# Altium footprint library Flyback Transformers.PcbLib: 66 footprints (part 1 of 5)
Each footprint in its own frame and in the unit in brackets; x right, y up, seen from the top. Pads: shape width x height; smd on the part's side, far side on the other; paste and mask are expansions set on the pad; w line width, h text height; cw(c..) or ccw(c..) is an arc to the next point about the centre after c.
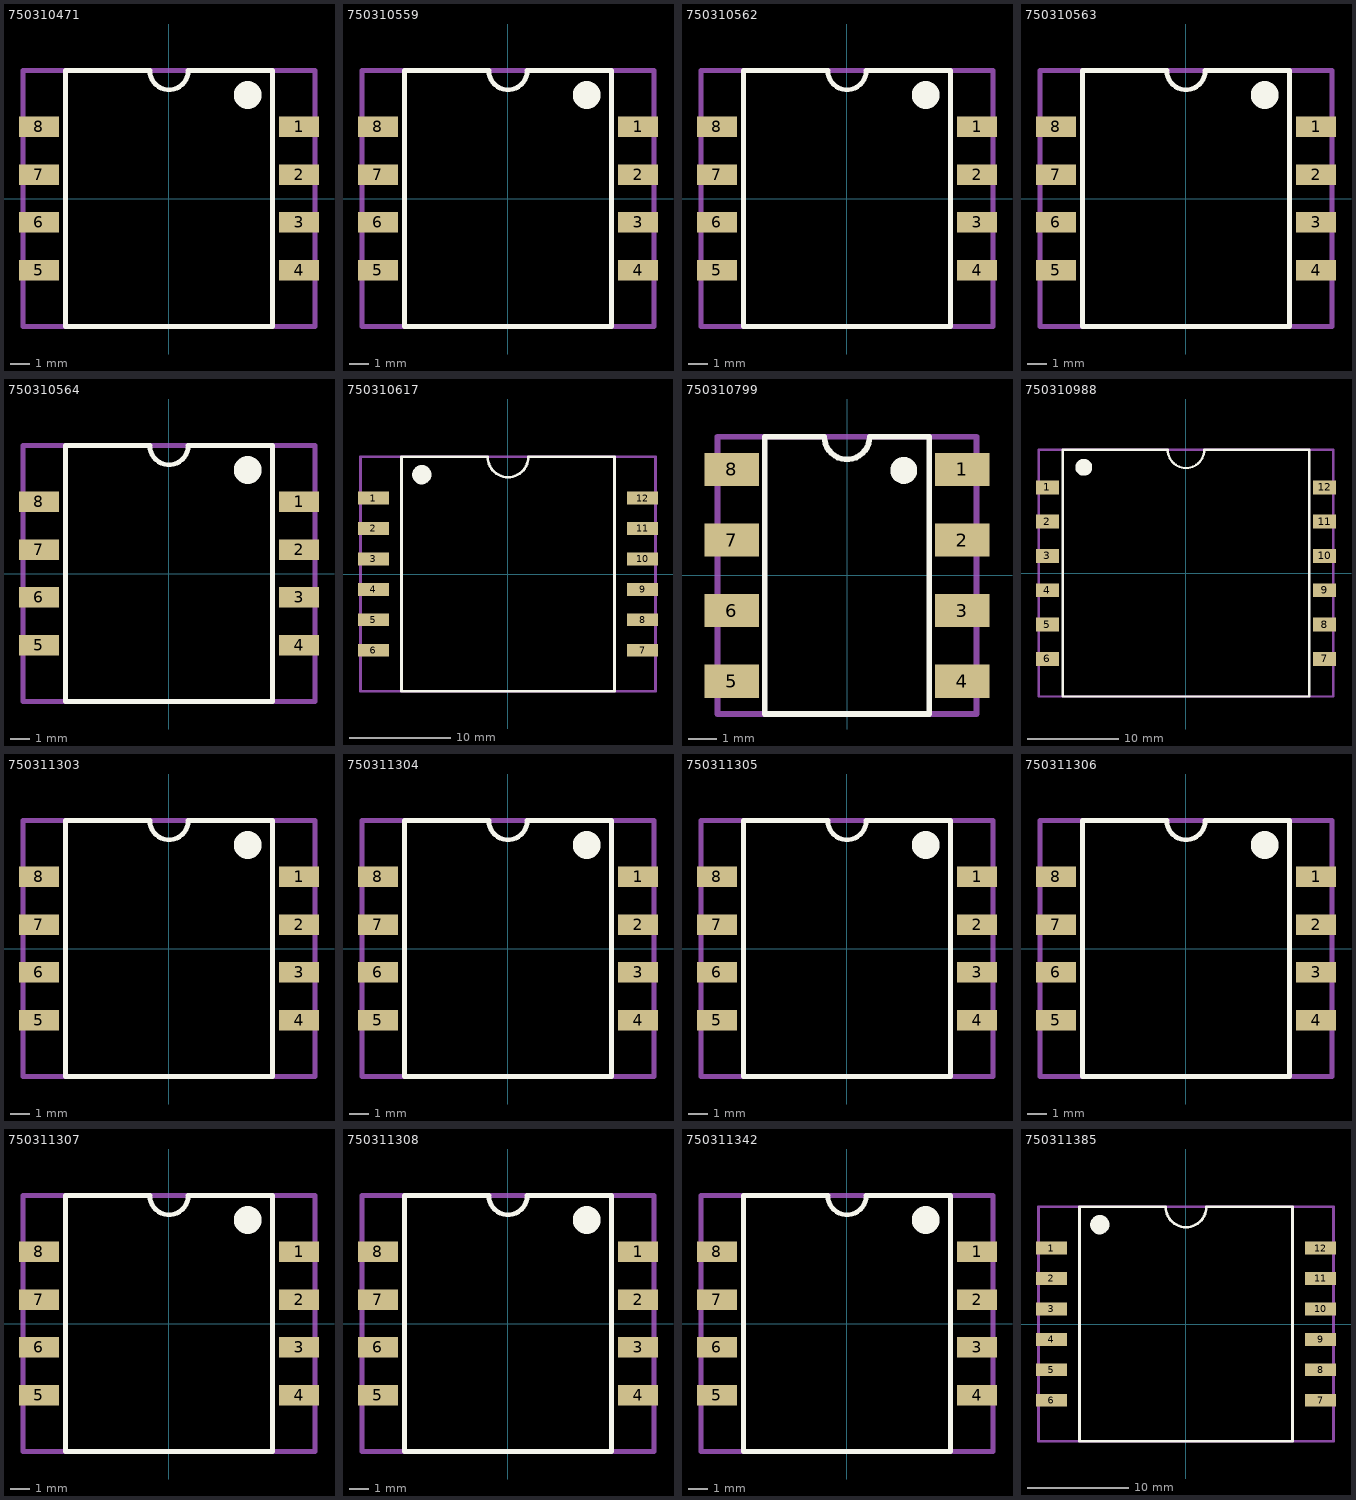
[diagram p0: the footprints below, top view; thin cyan lines are the x and y axes]

## 750310471 [mm] "Flyback Transformer, size EP10"
height 11.43
pads (8):
  rect 2.08x1.07 smd: 1(6.78,3.735) 2(6.78,1.245) 3(6.78,-1.245) 4(6.78,-3.735) 5(-6.78,-3.735) 6(-6.78,-1.245) 7(-6.78,1.245) 8(-6.78,3.735)
Top Overlay:
  circle w1: c4.1,5.4 r0.224
  lines w0.254: -5.4,-6.67 5.4,-6.67 5.4,6.67 1,6.67 cw(c0,6.67) -1,6.67 -5.4,6.67 -5.4,-6.67
Mechanical 13:
  lines w0.254: -7.62,-6.67 7.62,-6.67 7.62,6.67 -7.62,6.67 -7.62,-6.67
3D body "STEP-750310471-rev1.stp": height 11.44, standoff 0.01, extent -7.62,-5.9 7.62,5.9

## 750310559 [mm] "Flyback Transformer, size EP10"
height 11.43
pads (8):
  rect 2.08x1.07 smd: 1(6.78,3.735) 2(6.78,1.245) 3(6.78,-1.245) 4(6.78,-3.735) 5(-6.78,-3.735) 6(-6.78,-1.245) 7(-6.78,1.245) 8(-6.78,3.735)
Top Overlay:
  circle w1: c4.1,5.4 r0.224
  lines w0.254: -5.4,-6.67 5.4,-6.67 5.4,6.67 1,6.67 cw(c0,6.67) -1,6.67 -5.4,6.67 -5.4,-6.67
Mechanical 13:
  lines w0.254: -7.62,-6.67 7.62,-6.67 7.62,6.67 -7.62,6.67 -7.62,-6.67
3D body "STEP-750310559-rev1.stp": height 11.44, standoff 0.01, extent -7.62,-5.9 7.62,5.9

## 750310562 [mm] "Flyback Transformer, size EP10"
height 11.43
pads (8):
  rect 2.08x1.07 smd: 1(6.78,3.735) 2(6.78,1.245) 3(6.78,-1.245) 4(6.78,-3.735) 5(-6.78,-3.735) 6(-6.78,-1.245) 7(-6.78,1.245) 8(-6.78,3.735)
Top Overlay:
  circle w1: c4.1,5.4 r0.224
  lines w0.254: -5.4,-6.67 -5.4,6.67 -1,6.67 ccw(c0,6.67) 1,6.67 5.4,6.67 5.4,-6.67 -5.4,-6.67
Mechanical 13:
  lines w0.254: -7.62,-6.67 -7.62,6.67 7.62,6.67 7.62,-6.67 -7.62,-6.67
3D body "STEP-750310562-rev1.stp": height 11.44, standoff 0.01, extent -7.62,-5.9 7.62,5.9

## 750310563 [mm] "Flyback Transformer, size EP10"
height 11.43
pads (8):
  rect 2.08x1.07 smd: 1(6.78,3.735) 2(6.78,1.245) 3(6.78,-1.245) 4(6.78,-3.735) 5(-6.78,-3.735) 6(-6.78,-1.245) 7(-6.78,1.245) 8(-6.78,3.735)
Top Overlay:
  circle w1: c4.1,5.4 r0.224
  lines w0.254: -5.4,-6.67 -5.4,6.67 -1,6.67 ccw(c0,6.67) 1,6.67 5.4,6.67 5.4,-6.67 -5.4,-6.67
Mechanical 13:
  lines w0.254: -7.62,-6.67 -7.62,6.67 7.62,6.67 7.62,-6.67 -7.62,-6.67
3D body "STEP-750310563-rev1.stp": height 11.44, standoff 0.01, extent -7.62,-5.9 7.62,5.9

## 750310564 [mm] "Flyback Transformer, size EP10"
height 11.43
pads (8):
  rect 2.08x1.07 smd: 1(6.78,3.735) 2(6.78,1.245) 3(6.78,-1.245) 4(6.78,-3.735) 5(-6.78,-3.735) 6(-6.78,-1.245) 7(-6.78,1.245) 8(-6.78,3.735)
Top Overlay:
  circle w1: c4.1,5.4 r0.224
  lines w0.254: -5.4,-6.67 -5.4,6.67 -1,6.67 ccw(c0,6.67) 1,6.67 5.4,6.67 5.4,-6.67 -5.4,-6.67
Mechanical 13:
  lines w0.254: -7.62,-6.67 -7.62,6.67 7.62,6.67 7.62,-6.67 -7.62,-6.67
3D body "STEP-750310564-rev1.stp": height 11.44, standoff 0.01, extent -7.62,-5.9 7.62,5.9

## 750310617 [mm] "Flyback Transformer, size EFD20"
height 11.43
pads (12):
  rect 3.05x1.27 smd: 1(-13.26,7.5) 2(-13.26,4.5) 3(-13.26,1.5) 4(-13.26,-1.5) 5(-13.26,-4.5) 6(-13.26,-7.5) 7(13.26,-7.5) 8(13.26,-4.5) 9(13.26,-1.5) 10(13.26,1.5) 11(13.26,4.5) 12(13.26,7.5)
Top Overlay:
  circle w1: c-8.5,9.8 r0.447
  lines w0.254: -10.5,-11.555 10.5,-11.555 10.5,11.555 2,11.555 cw(c0,11.555) -2,11.555 -10.5,11.555 -10.5,-11.555
Mechanical 13:
  lines w0.254: -14.54,-11.555 -14.54,11.555 14.54,11.555 14.54,-11.555 -14.54,-11.555
3D body "STEP-750310617-rev1.stp": height 11.45, standoff 0.02, extent -14.54,-10 14.54,10

## 750310799 [mm] "Flyback Transformer, size EP7"
height 10.54
pads (8):
  rect 1.91x1.17 smd: 1(4.065,3.735) 2(4.065,1.245) 3(4.065,-1.245) 4(4.065,-3.735) 5(-4.065,-3.735) 6(-4.065,-1.245) 7(-4.065,1.245) 8(-4.065,3.735)
Top Overlay:
  circle w0.5: c2,3.7 r0.224
  lines w0.2: -2.9,-4.89 -2.9,4.89 -0.8,4.89 ccw(c0,4.89) 0.8,4.89 2.9,4.89 2.9,-4.89 -2.9,-4.89
Mechanical 13:
  lines w0.2: -4.57,-4.89 -4.57,4.89 4.57,4.89 4.57,-4.89 -4.57,-4.89
3D body "STEP-750310799-rev1 (1).stp": height 10.55, standoff 0.01, extent -4.57,-4.89 4.57,4.89

## 750310988 [mm] "Flyback Transformer, size EFD25"
height 13.69
pads (12):
  rect 2.5x1.52 smd: 1(-15.19,9.4) 2(-15.19,5.64) 3(-15.19,1.88) 4(-15.19,-1.88) 5(-15.19,-5.64) 6(-15.19,-9.4) 7(15.19,-9.4) 8(15.19,-5.64) 9(15.19,-1.88) 10(15.19,1.88) 11(15.19,5.64) 12(15.19,9.4)
Top Overlay:
  circle w1: c-11.2,11.6 r0.424
  lines w0.254: -13.5,-13.515 -13.5,13.515 -2,13.515 ccw(c0,13.515) 2,13.515 13.5,13.515 13.5,-13.515 -13.5,-13.515
Mechanical 13:
  lines w0.254: -16.155,-13.515 16.155,-13.515 16.155,13.515 -16.155,13.515 -16.155,-13.515
3D body "STEP-750310988-rev1.stp": height 13.05, standoff 0.05, extent -15.75,-12.5 15.75,12.5

## 750311303 [mm] "Flyback Transformer, size EP10"
height 11.43
pads (8):
  rect 2.08x1.07 smd: 1(6.78,3.735) 2(6.78,1.245) 3(6.78,-1.245) 4(6.78,-3.735) 5(-6.78,-3.735) 6(-6.78,-1.245) 7(-6.78,1.245) 8(-6.78,3.735)
Top Overlay:
  circle w1: c4.1,5.4 r0.224
  lines w0.254: -5.4,-6.67 5.4,-6.67 5.4,6.67 1,6.67 cw(c0,6.67) -1,6.67 -5.4,6.67 -5.4,-6.67
Mechanical 13:
  lines w0.254: -7.62,-6.67 7.62,-6.67 7.62,6.67 -7.62,6.67 -7.62,-6.67
3D body "STEP-750311303-rev1.stp": height 11.44, standoff 0.01, extent -7.62,-5.9 7.62,5.9

## 750311304 [mm] "Flyback Transformer, size EP10"
height 11.43
pads (8):
  rect 2.08x1.07 smd: 1(6.78,3.735) 2(6.78,1.245) 3(6.78,-1.245) 4(6.78,-3.735) 5(-6.78,-3.735) 6(-6.78,-1.245) 7(-6.78,1.245) 8(-6.78,3.735)
Top Overlay:
  circle w1: c4.1,5.4 r0.224
  lines w0.254: -5.4,-6.67 5.4,-6.67 5.4,6.67 1,6.67 cw(c0,6.67) -1,6.67 -5.4,6.67 -5.4,-6.67
Mechanical 13:
  lines w0.254: -7.62,-6.67 7.62,-6.67 7.62,6.67 -7.62,6.67 -7.62,-6.67
3D body "STEP-750311304-rev1.stp": height 11.44, standoff 0.01, extent -7.62,-5.9 7.62,5.9

## 750311305 [mm] "Flyback Transformer, size EP10"
height 11.43
pads (8):
  rect 2.08x1.07 smd: 1(6.78,3.735) 2(6.78,1.245) 3(6.78,-1.245) 4(6.78,-3.735) 5(-6.78,-3.735) 6(-6.78,-1.245) 7(-6.78,1.245) 8(-6.78,3.735)
Top Overlay:
  circle w1: c4.1,5.4 r0.224
  lines w0.254: -5.4,-6.67 -5.4,6.67 -1,6.67 ccw(c0,6.67) 1,6.67 5.4,6.67 5.4,-6.67 -5.4,-6.67
Mechanical 13:
  lines w0.254: -7.62,-6.67 -7.62,6.67 7.62,6.67 7.62,-6.67 -7.62,-6.67
3D body "STEP-750311305-rev1.stp": height 11.44, standoff 0.01, extent -7.62,-5.9 7.62,5.9

## 750311306 [mm] "Flyback Transformer, size EP10"
height 11.43
pads (8):
  rect 2.08x1.07 smd: 1(6.78,3.735) 2(6.78,1.245) 3(6.78,-1.245) 4(6.78,-3.735) 5(-6.78,-3.735) 6(-6.78,-1.245) 7(-6.78,1.245) 8(-6.78,3.735)
Top Overlay:
  circle w1: c4.1,5.4 r0.224
  lines w0.254: -5.4,-6.67 5.4,-6.67 5.4,6.67 1,6.67 cw(c0,6.67) -1,6.67 -5.4,6.67 -5.4,-6.67
Mechanical 13:
  lines w0.254: -7.62,-6.67 7.62,-6.67 7.62,6.67 -7.62,6.67 -7.62,-6.67
3D body "STEP-750311306-rev1.stp": height 11.44, standoff 0.01, extent -7.62,-5.9 7.62,5.9

## 750311307 [mm] "Flyback Transformer, size EP10"
height 11.43
pads (8):
  rect 2.08x1.07 smd: 1(6.78,3.735) 2(6.78,1.245) 3(6.78,-1.245) 4(6.78,-3.735) 5(-6.78,-3.735) 6(-6.78,-1.245) 7(-6.78,1.245) 8(-6.78,3.735)
Top Overlay:
  circle w1: c4.1,5.4 r0.224
  lines w0.254: -5.4,-6.67 -5.4,6.67 -1,6.67 ccw(c0,6.67) 1,6.67 5.4,6.67 5.4,-6.67 -5.4,-6.67
Mechanical 13:
  lines w0.254: -7.62,-6.67 -7.62,6.67 7.62,6.67 7.62,-6.67 -7.62,-6.67
3D body "STEP-750311307-rev1.stp": height 11.44, standoff 0.01, extent -7.62,-5.9 7.62,5.9

## 750311308 [mm] "Flyback Transformer, size EP10"
height 11.43
pads (8):
  rect 2.08x1.07 smd: 1(6.78,3.735) 2(6.78,1.245) 3(6.78,-1.245) 4(6.78,-3.735) 5(-6.78,-3.735) 6(-6.78,-1.245) 7(-6.78,1.245) 8(-6.78,3.735)
Top Overlay:
  circle w1: c4.1,5.4 r0.224
  lines w0.254: -5.4,-6.67 -5.4,6.67 -1,6.67 ccw(c0,6.67) 1,6.67 5.4,6.67 5.4,-6.67 -5.4,-6.67
Mechanical 13:
  lines w0.254: -7.62,-6.67 -7.62,6.67 7.62,6.67 7.62,-6.67 -7.62,-6.67
3D body "STEP-750311308-rev1.stp": height 11.44, standoff 0.01, extent -7.62,-5.9 7.62,5.9

## 750311342 [mm] "Flyback Transformer, size EP10"
height 11.43
pads (8):
  rect 2.08x1.07 smd: 1(6.78,3.735) 2(6.78,1.245) 3(6.78,-1.245) 4(6.78,-3.735) 5(-6.78,-3.735) 6(-6.78,-1.245) 7(-6.78,1.245) 8(-6.78,3.735)
Top Overlay:
  circle w1: c4.1,5.4 r0.224
  lines w0.254: -5.4,-6.67 5.4,-6.67 5.4,6.67 1,6.67 cw(c0,6.67) -1,6.67 -5.4,6.67 -5.4,-6.67
Mechanical 13:
  lines w0.254: -7.62,-6.67 7.62,-6.67 7.62,6.67 -7.62,6.67 -7.62,-6.67
3D body "STEP-750311342-rev1.stp": height 11.44, standoff 0.01, extent -7.62,-5.9 7.62,5.9

## 750311385 [mm] "Flyback Transformer, size EFD20"
height 11.43
pads (12):
  rect 3.05x1.27 smd: 1(-13.26,7.5) 2(-13.26,4.5) 3(-13.26,1.5) 4(-13.26,-1.5) 5(-13.26,-4.5) 6(-13.26,-7.5) 7(13.26,-7.5) 8(13.26,-4.5) 9(13.26,-1.5) 10(13.26,1.5) 11(13.26,4.5) 12(13.26,7.5)
Top Overlay:
  circle w1: c-8.5,9.8 r0.447
  lines w0.254: -10.5,-11.555 10.5,-11.555 10.5,11.555 2,11.555 cw(c0,11.555) -2,11.555 -10.5,11.555 -10.5,-11.555
Mechanical 13:
  lines w0.254: -14.54,-11.555 -14.54,11.555 14.54,11.555 14.54,-11.555 -14.54,-11.555
3D body "STEP-750311385-rev1.stp": height 11.45, standoff 0.02, extent -14.54,-10 14.54,10